# Altium footprint library 晶体管封装库.PcbLib: 101 footprints (part 5 of 7)
Each footprint in its own frame and in the unit in brackets; x right, y up, seen from the top. Pads: shape width x height; smd on the part's side, far side on the other; paste and mask are expansions set on the pad; w line width, h text height; cw(c..) or ccw(c..) is an arc to the next point about the centre after c.
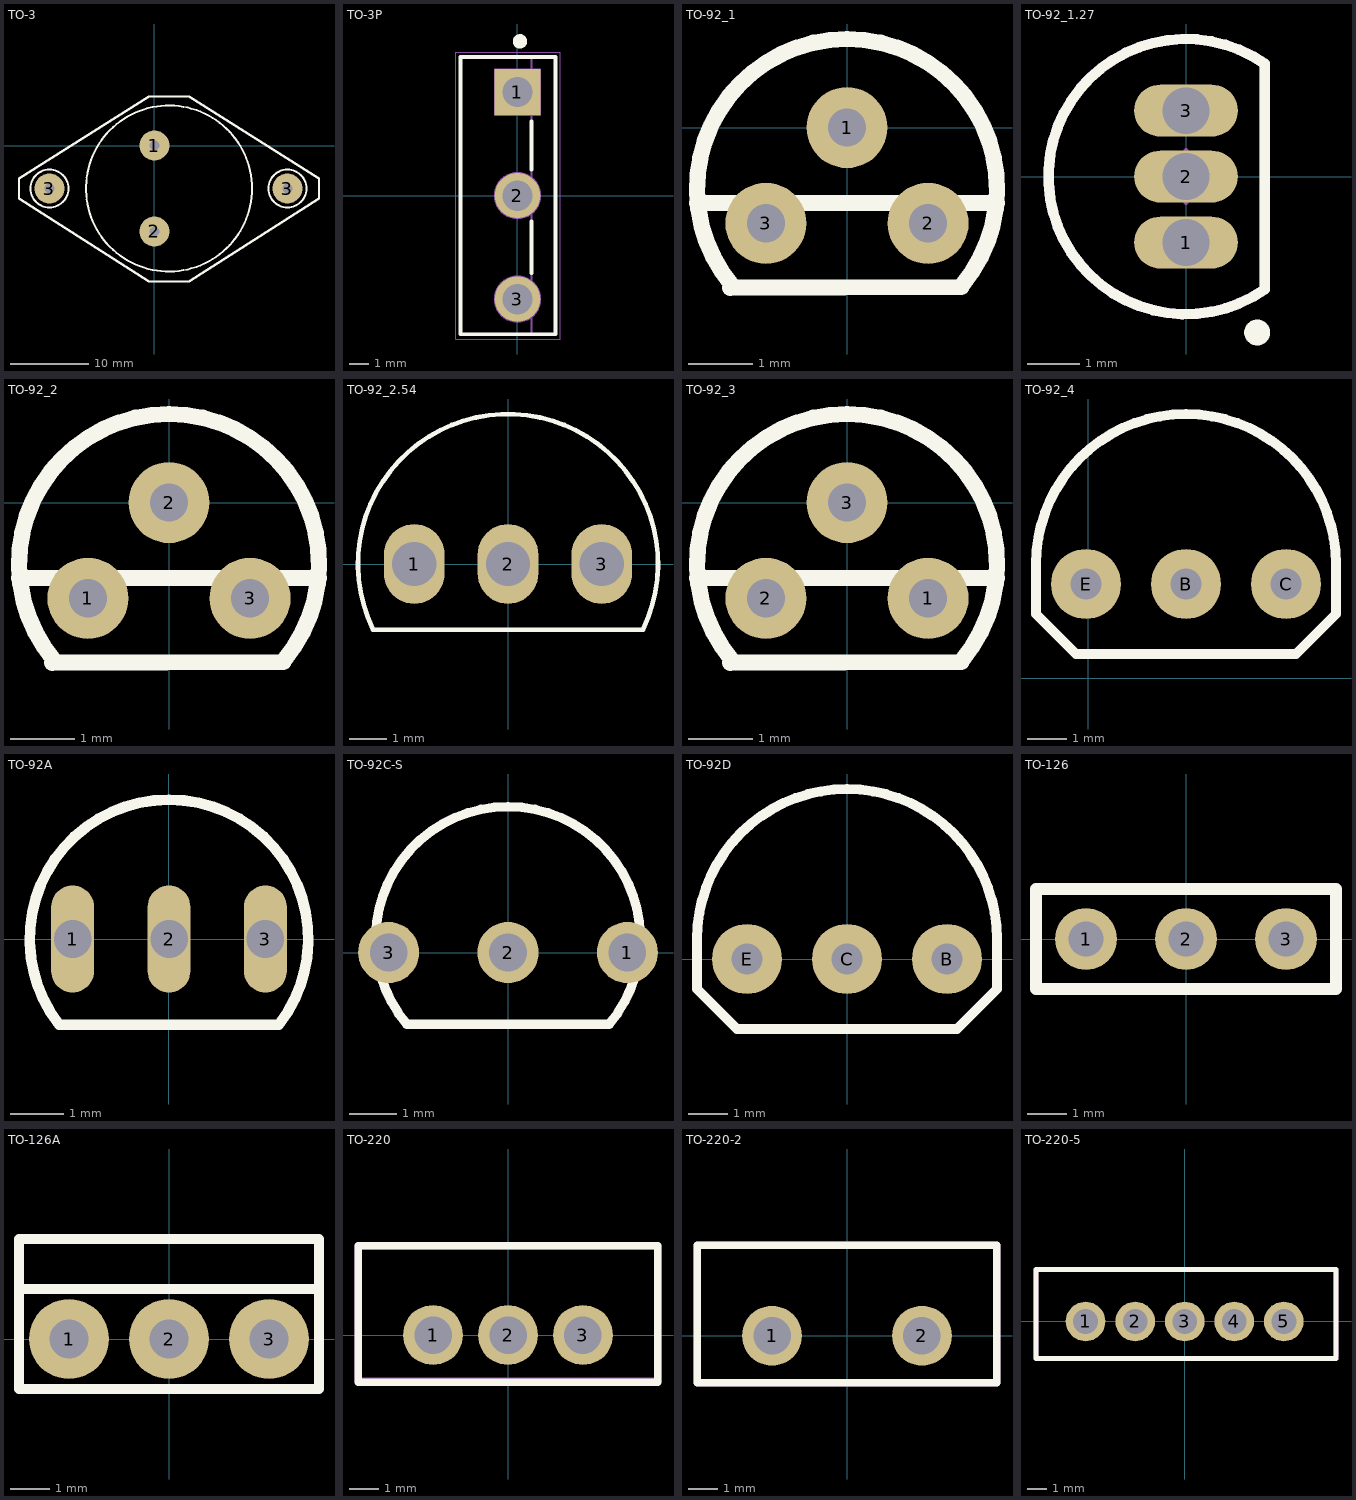
[diagram p4: the footprints below, top view; thin cyan lines are the x and y axes]

## TO-3 [mil]
pads (4):
  round 150 hole 50: 1(0,0) 2(0,-430) 3(-525,-215) 3(665,-215)
Top Overlay:
  circle w10: c-525,-215 r95
  circle w10: c665,-215 r95
  circle w10: c73,-215 r415
  lines w12: -677,-265 -677,-165 -27,245 173,245 823,-165 823,-265 173,-680 -27,-680 -677,-265

## TO-3P [mm]
pads (3):
  rect 2.4x2.4 / inner round 2.4 / far side rect 2.4x2.4 hole 1.6: 1(0,5.45)
  round 2.4 hole 1.6: 2(0,0) 3(0,-5.45)
Top Overlay:
  circle w0.508: c0.129,8.117 r0.125
  lines w0.2: 0.73,-4.083 0.73,-1.367 ; 0.73,1.367 0.73,3.9 ; -3,-7.3 -3,7.3 2,7.3 2,-7.3 -3,-7.3
Mechanical 15:
  circle w0.1: c0,-5.45 r1.2
  circle w0.1: c0,0 r1.2
  lines w0.1: 0.73,-7.3 0.73,7.3 ; -3,-7.3 -3,7.3 2,7.3 2,-7.3 -3,-7.3 ; -1.2,4.25 1.2,4.25 1.2,6.65 -1.2,6.65 -1.2,4.25
Mechanical 16:
  circle w0.05: c0,5.45 r0.35
  lines w0.001: -3,-7.3 -3,7.3 2,7.3 2,-7.3 -3,-7.3
  lines w0.05: -0.5,5.45 0.5,5.45 ; 0,4.95 0,5.95 ; -3.25,-7.55 -3.25,7.55 2.25,7.55 2.25,-7.55 -3.25,-7.55

## TO-92_1 [mm]
pads (3):
  round 1.27 hole 0.6: 1(0,0) 2(1.27,-1.5) 3(-1.27,-1.5)
Top Overlay:
  lines w0.254: -2.35,-1.18 2.35,-1.18 ; -1.83,-2.51 1.79,-2.5 ; -1.8,-2.473 cw(c0,-0.963) 1.8,-2.473

## TO-92_1.27 [mm]
pads (3):
  oval 2x1 hole 0.9: 1(0,-1.27) 2(0,0) 3(0,1.27)
Top Overlay:
  circle w0.25: c1.371,-3.003 r0.125
  lines w0.2: 1.52,-2.171 cw(c0,0) 1.52,2.171 1.52,-2.171
Mechanical 13:
  lines w0.2: 1.52,-2.171 cw(c0,0) 1.52,2.171 1.52,-2.171
Mechanical 15:
  lines w0.1: -0.5,0 0.5,0 ; 0,-0.5 0,0.5
3D body: height 10.31, standoff -5.8, extent -3.15,-3.09 1.66,3.11

## TO-92_2 [mm]
pads (3):
  round 1.27 hole 0.6: 1(-1.27,-1.5) 2(0,0) 3(1.27,-1.5)
Top Overlay:
  lines w0.254: -2.35,-1.18 2.35,-1.18 ; -1.83,-2.51 1.79,-2.5 ; -1.8,-2.473 cw(c0,-0.963) 1.8,-2.473

## TO-92_2.54 [mil]
pads (3):
  oval 65x85 hole 47.24: 1(-100,0) 2(0,0) 3(100,0)
Top Overlay:
  lines w5: -144.36,-70 144.36,-70 ; -144.36,-69.18 cw(c0,0) 144.36,-69.18
3D body: height 314.96, standoff 78.74, extent -161,-70 162,161
3D body: height 78.74, standoff -78.74, extent 80,-20.65 119.21,18.65
3D body: height 78.74, standoff -78.74, extent -20,-20.65 19.21,18.65
3D body: height 78.74, standoff -78.74, extent -120.21,-19.65 -81,19.65

## TO-92_3 [mm]
pads (3):
  round 1.27 hole 0.6: 1(1.27,-1.5) 2(-1.27,-1.5) 3(0,0)
Top Overlay:
  lines w0.254: -2.35,-1.18 2.35,-1.18 ; -1.83,-2.51 1.79,-2.5 ; -1.8,-2.473 cw(c0,-0.963) 1.8,-2.473

## TO-92_4 [mil]
pads (3):
  round 70 hole 31.5: B(98,94) C(198,94) E(-2,94)
Top Overlay:
  lines w10: -52,64 -12,24 208,24 248,64 248,114 ccw(c98,114) -52,114 -52,64

## TO-92A [mm]
pads (3):
  oval 0.8x2 hole 0.7: 1(-1.8,0) 2(0,0) 3(1.8,0)
Top Overlay:
  lines w0.2: -2.049,-1.601 cw(c0,0) 2.049,-1.601 ; -1.99,-1.6 1.99,-1.6
3D body: height 8, standoff 3, extent -2.6,-1.657 2.602,2.612
3D body: height 3, standoff 0, extent 1.583,-0.254 2.023,0.246
3D body: height 3, standoff 0, extent -0.22,-0.25 0.22,0.25
3D body: height 3, standoff 0, extent -2.04,-0.25 -1.6,0.25

## TO-92C-S [mm]
height 10
pads (3):
  round 1.3 hole 0.8: 1(2.54,0) 2(0,0) 3(-2.54,0)
Top Overlay:
  lines w0.2: -2.157,-1.522 cw(c0,0.288) 2.157,-1.522 -2.157,-1.522
3D body: height 10.33, standoff -7.7, extent -2.888,-1.53 2.852,2.66

## TO-92D [mil]
pads (3):
  round 70 hole 31.5: B(100,0) C(0,0) E(-100,0)
Top Overlay:
  lines w10: -150,-30 -150,20 cw(c0,20) 150,20 150,-30 110,-70 -110,-70 -150,-30

## TO-126 [mil]
pads (3):
  round 62 hole 35.43: 1(-100,0) 2(0,0) 3(100,0)
Top Overlay:
  lines w12: -150,-50 -150,50 150,50 150,-50 -150,-50
3D body: height 551.18, standoff -118.11, extent -156.3,-53.54 158.66,52.76

## TO-126A [mil]
pads (3):
  round 80 hole 39: 1(-100,0) 2(0,0) 3(100,0)
Top Overlay:
  lines w10: 150,40 150,100 -150,100 -150,50 ; -150,50 150,50 150,-50 -150,-50 -150,50

## TO-220 [mil]
pads (3):
  round 80 hole 50: 1(-100,0) 2(0,0) 3(100,0)
Top Overlay:
  lines w10: -200,-63 -200,0 -200,119 200,119 200,0 200,-63 -200,-63
Mechanical 15:
  lines w10: -200,-62 200,-62 200,119 -200,119 -200,-62
3D body: height 789.33, standoff -375.67, extent -205,-61.5 205,123.5

## TO-220-2 [mil]
pads (2):
  round 80 hole 50: 1(-100,0) 2(100,0)
Top Overlay:
  lines w10: -200,-63 200,-63 200,0 200,121 -200,121 -200,0 -200,-63
Mechanical 15:
  lines w10: -200,-63 -200,121 200,121 200,-63 -200,-63
3D body: height 789.33, standoff -375.67, extent -205,-61.5 205,123.5

## TO-220-5 [mil]
pads (5):
  round 80 hole 50: 1(-200,0) 2(-100,0) 3(0,0) 4(100,0) 5(200,0)
Top Overlay:
  lines w10: 305,-74.8 -300,-74.8 -300,0 -300,105.12 305.12,105.12 ; 305,-70 305,105
Mechanical 15:
  lines w10: -300,-75 -300,105 305,105 305,-75 -300,-75
3D body: height 354.33, standoff 314.96, extent -24,-9 22,7
3D body: height 314.96, standoff -82.68, extent -16,-9 14,7
3D body: height 354.33, standoff 314.96, extent -123,-8 -77,8
3D body: height 314.96, standoff -82.68, extent -115,-8 -85,8
3D body: height 354.33, standoff 314.96, extent -224,-9 -178,7
3D body: height 314.96, standoff -82.68, extent -216,-9 -186,7
3D body: height 688.98, standoff 354.33, extent -300,-75 305,105
3D body: height 925.2, standoff 688.98, extent -301,50 305,105
3D body: height 314.96, standoff -82.68, extent -16,-9 14,7
3D body: height 314.96, standoff -82.68, extent 84,-9 114,7
3D body: height 314.96, standoff -82.68, extent 184,-9 214,7
3D body: height 354.33, standoff 314.96, extent 76,-9 122,7
3D body: height 354.33, standoff 314.96, extent 176,-9 222,7